# Altium footprint library OXI_ONE.PcbLib: 74 footprints (part 1 of 5)
Each footprint in its own frame and in the unit in brackets; x right, y up, seen from the top. Pads: shape width x height; smd on the part's side, far side on the other; paste and mask are expansions set on the pad; w line width, h text height; cw(c..) or ccw(c..) is an arc to the next point about the centre after c.
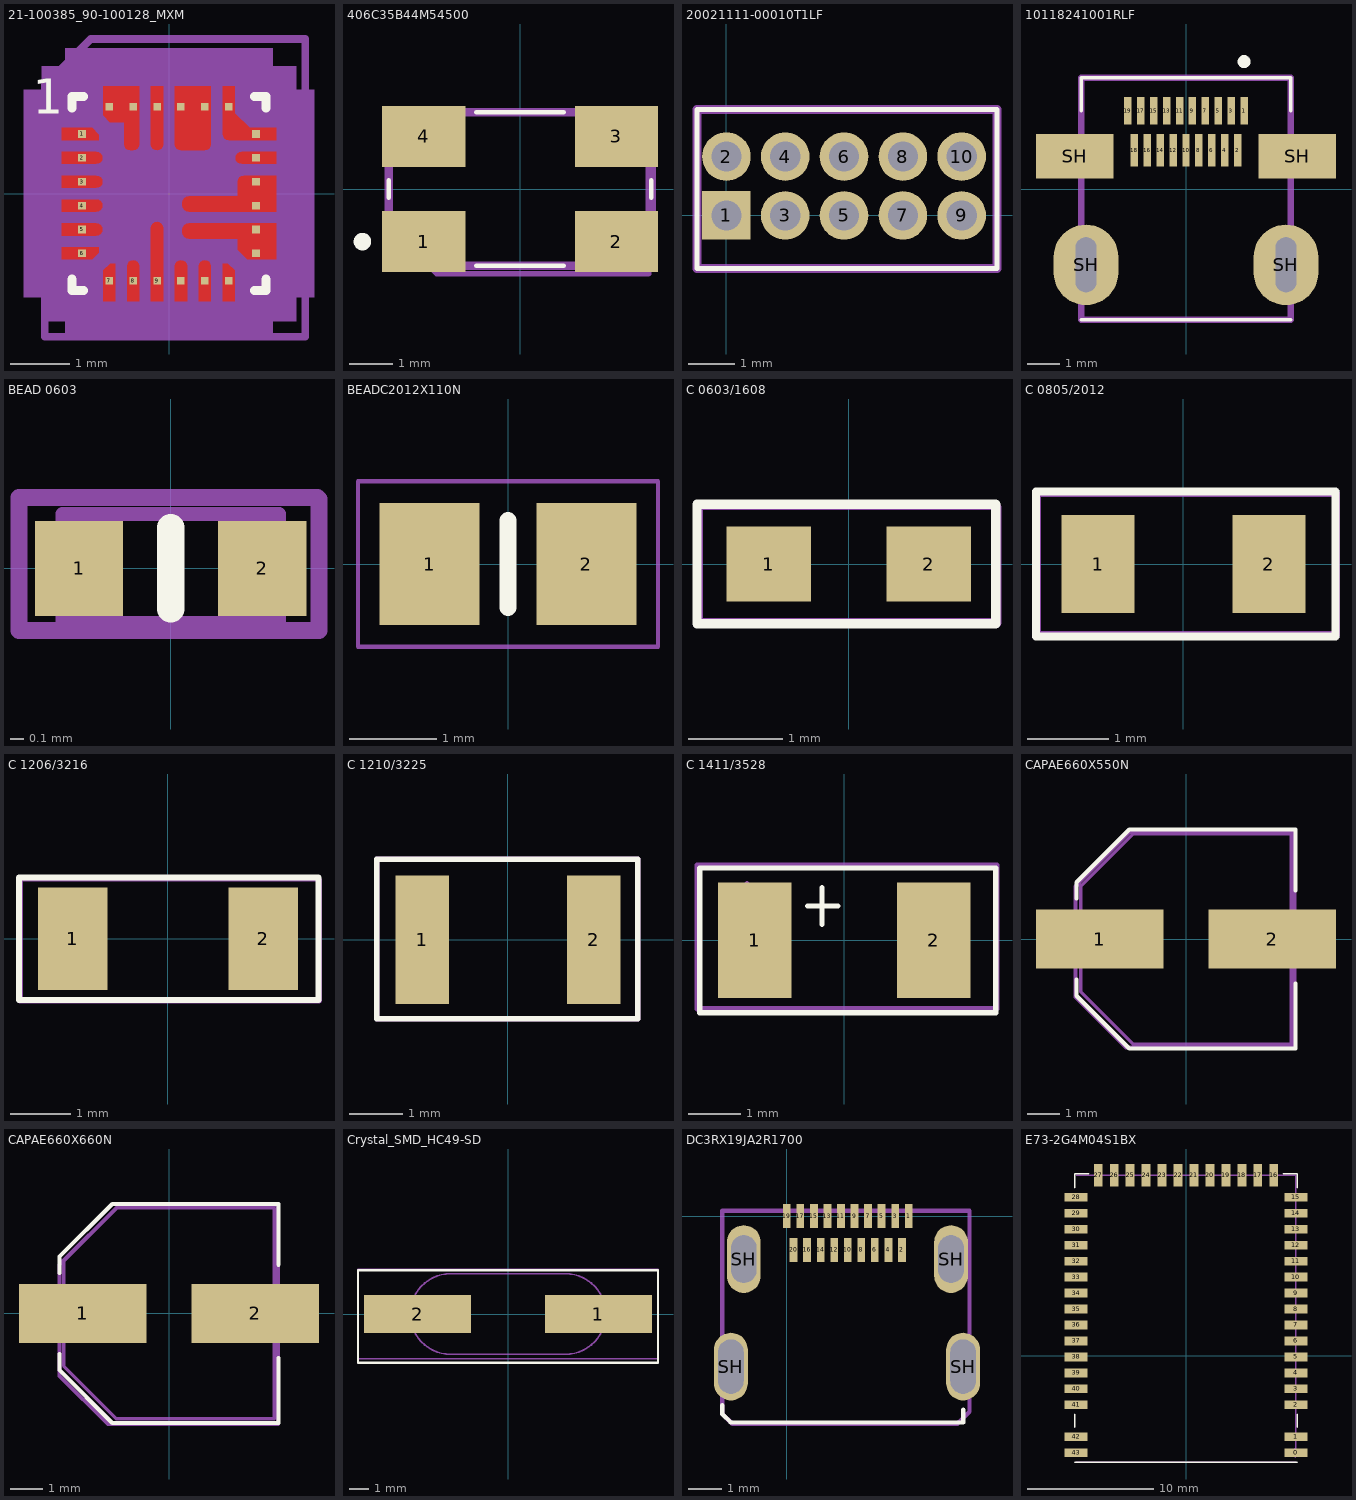
[diagram p0: the footprints below, top view; thin cyan lines are the x and y axes]

## 21-100385_90-100128_MXM [mil]
pads (24):
  rect 5x5 smd: 1(-57.36,39.37) 2(-57.36,23.62) 3(-57.36,7.87) 4(-57.36,-7.87) 5(-57.36,-23.62) 6(-57.36,-39.37) 7(-39.37,-57.36) 8(-23.62,-57.36) 9(-7.87,-57.36) 10(7.87,-57.36) 11(23.62,-57.36) 12(39.37,-57.36) 13(57.36,-39.37) 14(57.36,-23.62) 15(57.36,-7.87) 16(57.36,7.87) 17(57.36,23.62) 18(57.36,39.37) 19(39.37,57.36) 20(23.62,57.36) 21(7.87,57.36) 22(-7.87,57.36) 23(-23.62,57.36) 24(-39.37,57.36)
Top Layer:
  region: 49.26,11.87 70.86,11.87 70.86,-11.87 12.88,-11.87 11.35,-11.57 10.05,-10.7 9.18,-9.4 8.88,-7.87 8.88,-5.87 9.18,-4.34 10.05,-3.04 11.35,-2.17 12.88,-1.87 45.27,-1.87 45.26,7.87 45.56,9.4 46.43,10.7 47.73,11.57
  region: 35.37,43.86 35.37,70.86 43.37,70.86 43.37,53.15 53.15,43.37 70.86,43.37 70.86,35.37 43.86,35.37 39.41,35.37 37.88,35.67 36.59,36.54 35.72,37.84 35.41,39.37
  region: 3.87,32.56 3.87,70.86 27.62,70.86 27.62,32.56 27.32,31.03 26.45,29.73 25.15,28.87 23.62,28.56 7.87,28.56 6.34,28.87 5.05,29.73 4.18,31.03
  region: 47.88,19.62 70.86,19.62 70.86,27.62 47.88,27.62 46.35,27.32 45.05,26.45 44.18,25.15 43.88,23.62 44.18,22.09 45.05,20.79 46.35,19.93
  region: 51.65,-43.37 70.86,-43.37 70.86,-19.62 12.88,-19.62 11.35,-19.93 10.05,-20.79 9.18,-22.09 8.88,-23.62 8.88,-25.63 9.18,-27.16 10.05,-28.46 11.35,-29.33 12.88,-29.63 45.27,-29.62 45.27,-36.99
  region: 35.37,-70.86 35.37,-46.26 38.83,-46.26 43.37,-50.67 43.37,-70.86
  region: 19.62,-47.88 19.62,-70.86 27.62,-70.86 27.62,-47.88 27.32,-46.35 26.45,-45.05 25.15,-44.18 23.62,-43.88 22.09,-44.18 20.79,-45.05 19.93,-46.35
  region: 3.87,-47.88 3.87,-70.86 11.87,-70.86 11.87,-47.88 11.57,-46.35 10.7,-45.05 9.4,-44.18 7.87,-43.88 6.34,-44.18 5.05,-45.05 4.18,-46.35
  region: -43.37,51.65 -43.37,70.86 -19.62,70.86 -19.62,32.56 -19.93,31.03 -20.79,29.73 -22.09,28.87 -23.62,28.56 -25.63,28.56 -27.16,28.87 -28.46,29.73 -29.33,31.03 -29.63,32.56 -29.62,47.24 -38.96,47.24
  region: -47.88,11.87 -70.86,11.87 -70.86,3.87 -47.88,3.87 -46.35,4.18 -45.05,5.05 -44.18,6.34 -43.88,7.87 -44.18,9.4 -45.05,10.7 -46.35,11.57
  region: -47.88,27.62 -70.86,27.62 -70.86,19.62 -47.88,19.62 -46.35,19.93 -45.05,20.79 -44.18,22.09 -43.88,23.62 -44.18,25.15 -45.05,26.45 -46.35,27.32
  region: -70.86,35.37 -46.26,35.37 -46.26,38.83 -50.67,43.37 -70.86,43.37
  region: -3.87,32.56 -3.87,70.86 -11.87,70.86 -11.87,32.56 -11.57,31.03 -10.7,29.73 -9.4,28.87 -7.87,28.56 -6.34,28.87 -5.05,29.73 -4.18,31.03
  region: -70.86,-35.37 -46.26,-35.37 -46.26,-38.83 -50.67,-43.37 -70.86,-43.37
  region: -47.88,-19.62 -70.86,-19.62 -70.86,-27.62 -47.88,-27.62 -46.35,-27.32 -45.05,-26.45 -44.18,-25.15 -43.88,-23.62 -44.18,-22.09 -45.05,-20.79 -46.35,-19.93
  region: -47.88,-3.87 -70.86,-3.87 -70.86,-11.87 -47.88,-11.87 -46.35,-11.57 -45.05,-10.7 -44.18,-9.4 -43.88,-7.87 -44.18,-6.34 -45.05,-5.05 -46.35,-4.18
  region: -35.37,-70.86 -35.37,-46.26 -38.83,-46.26 -43.37,-50.67 -43.37,-70.86
  region: -70.86,-35.37 -46.26,-35.37 -46.26,-38.83 -50.67,-43.37 -70.86,-43.37
  region: -11.87,-22.68 -11.87,-70.86 -3.87,-70.86 -3.87,-22.68 -4.18,-21.15 -5.05,-19.85 -6.34,-18.99 -7.87,-18.68 -9.4,-18.99 -10.7,-19.85 -11.57,-21.15
  region: -27.62,-47.88 -27.62,-70.86 -19.62,-70.86 -19.62,-47.88 -19.93,-46.35 -20.79,-45.05 -22.09,-44.18 -23.62,-43.88 -25.15,-44.18 -26.45,-45.05 -27.32,-46.35
Top Overlay:
  lines w6: -64,-56.47 -64,-64 -56.47,-64 ; -64,56.47 -64,64 -56.47,64 ; 56.47,-64 64,-64 64,-56.47 ; 56.47,64 64,64 64,56.47
  text "1" at -90,45 h39.37
Top Paste:
  drawing of 19 lines, arcs and shapes, not listed
Top Solder:
  drawing of 19 lines, arcs and shapes, not listed
Bottom Assembly:
  region: 68.37,95.86 -68.37,95.86 -68.37,84 -84,84 -84,68.37 -95.86,68.37 -95.86,-68.37 -84,-68.37 -84,-84 -68.37,-84 -68.37,-95.86 68.37,-95.86 68.37,-84 84,-84 84,-68.37 95.86,-68.37 95.86,68.37 84,68.37 84,84 68.37,84
Mechanical 13:
  lines w1: -59,9 -9,59 ; -59,-59 59,-59 59,59 -59,59 -59,-59
Mechanical 15:
  region: 53.37,80.86 -53.37,80.86 -53.37,69 -69,69 -69,53.37 -80.86,53.37 -80.86,-53.37 -69,-53.37 -69,-69 -53.37,-69 -53.37,-80.86 53.37,-80.86 53.37,-69 69,-69 69,-53.37 80.86,-53.37 80.86,53.37 69,53.37 69,69 53.37,69
  lines w6: -80.86,-53.37 -80.86,53.37 -69,53.37 -69,69 -53.37,69 -53.37,80.86 53.37,80.86 53.37,69 69,69 69,53.37 80.86,53.37 80.86,-53.37 69,-53.37 69,-69 53.37,-69 53.37,-80.86 -53.37,-80.86 -53.37,-69 -69,-69 -69,-53.37 -80.86,-53.37
Top Assembly (Mech29):
  lines w5: -82,-94.5 90,-94.5 90,102 -51.5,102 -82,71.5 -82,-94.5
  text ".Designator" at -60.5,-43.5 h39.37
3D body: height 10, standoff 0, extent -60,-60 60,60

## 406C35B44M54500 [mm]
pads (4):
  rect 1.9x1.4 smd: 1(-2.2,-1.2) 2(2.2,-1.2) 3(2.2,1.2) 4(-2.2,1.2)
Top Overlay:
  lines w0.1: -3,-0.2 -3,0.2 ; -1,-1.75 1,-1.75 ; -1,1.75 1,1.75 ; 3,-0.2 3,0.2
  lines w0.2: -3.6,-1.3 cw(c-3.6,-1.2) -3.6,-1.1 cw(c-3.6,-1.2) -3.6,-1.3
Mechanical 13:
  lines w0.2: -3,-1.75 3,-1.75 3,1.75 -3,1.75 -3,-1.75
Top Assembly (Mech29):
  lines w0.127: -3,-0.835 -3,1.791 2.934,1.791 2.934,-1.93 -1.905,-1.93 -3,-0.835
  text ".Designator" at -2.108,-0.483 h1
3D body "406I35D08M00000.stp": height 1.3, standoff 0, extent -3.01,-1.76 3.01,1.76

## 20021111-00010T1LF [mm]
pads (10):
  rect 1.05x1.05 hole 0.65: 1(0,0)
  round 1.05 hole 0.65: 2(0,1.27) 3(1.27,0) 4(1.27,1.27) 5(2.54,0) 6(2.54,1.27) 7(3.81,0) 8(3.81,1.27) 9(5.08,0) 10(5.08,1.27)
Top Overlay:
  lines w0.1: -0.635,-1.145 -0.635,2.286 5.842,2.286 5.842,-1.145 -0.635,-1.145
Top Assembly (Mech29):
  lines w0.2: -0.635,-1.145 5.842,-1.145 5.842,2.286 -0.635,2.286 -0.635,-1.145
  text ".Designator" at 0.381,0.254 h1
3D body "20021111-00010XXLFc.stp": height 5.5, standoff -2.35, extent -0.635,-1.143 5.715,2.257

## 10118241001RLF [mm]
pads (23):
  rect 0.23x0.85 smd: 1(1.8,2.425) 3(1.4,2.425) 5(1,2.425) 7(0.6,2.425) 9(0.2,2.425) 11(-0.2,2.425) 13(-0.6,2.425) 15(-1,2.425) 17(-1.4,2.425) 19(-1.8,2.425)
  rect 0.23x1 smd: 2(1.6,1.2) 4(1.2,1.2) 6(0.8,1.2) 8(0.4,1.2) 10(0,1.2) 12(-0.4,1.2) 14(-0.8,1.2) 16(-1.2,1.2) 18(-1.6,1.2)
  rect 2.4x1.38 smd: SH(-3.45,1.02) SH(3.45,1.02)
  oval 2x2.5 hole 0.65 slot 1.7 at 90 deg: SH(-3.1,-2.35) SH(3.1,-2.35)
Top Overlay:
  lines w0.1: -3.25,-4.05 3.25,-4.05 ; -3.25,2.425 -3.25,3.45 3.25,3.45 3.25,2.425
  lines w0.2: 1.7,3.95 ccw(c1.8,3.95) 1.9,3.95 ccw(c1.8,3.95) 1.7,3.95
Top Assembly (Mech29):
  lines w0.2: -3.25,-4.05 3.25,-4.05 3.25,3.45 -3.25,3.45 -3.25,-4.05
  text ".Designator" at -1.27,-1.016 h1
3D body "10118241-001rlf_asm.STEP": height 3.08, standoff -0.45, extent -4.45,-4.833 4.45,2.667

## BEAD 0603 [mm]
pads (2):
  rect 0.65x0.7 smd: 1(-0.675,0) 2(0.675,0)
Top Overlay:
  lines w0.2: 0,-0.3 0,0.3
Mechanical 13:
  lines w0.1: -0.8,-0.4 -0.8,0.4 0.8,0.4 0.8,-0.4 -0.8,-0.4
Top Assembly (Mech29):
  lines w0.127: -1.118,-0.457 1.092,-0.457 1.092,0.508 1.079,0.521 -1.118,0.521 -1.118,-0.457
  text ".Designator" at -0.991,-0.406 h1
3D body "BLM18AG121SN1D.stp": height 0.8, standoff 0, extent -0.8,-0.4 0.8,0.4

## BEADC2012X110N [mm]
pads (2):
  rect 1.15x1.4 smd: 1(-0.9,0) 2(0.9,0)
Top Overlay:
  lines w0.2: 0,-0.5 0,0.5
Top Assembly (Mech29):
  lines w0.05: -1.725,-0.95 -1.725,0.95 1.725,0.95 1.725,-0.95 -1.725,-0.95
  text ".Designator" at -1.524,-0.699 h1
3D body "MH2029-121Y.stp": height 1.1, standoff 0, extent -1,-0.6 1,0.6

## C 0603/1608 [mm]
pads (2):
  rect 0.9x0.8 smd: 1(-0.85,0) 2(0.85,0)
Top Overlay:
  lines w0.1: -1.612,-0.635 -1.612,0.635 1.563,0.635 1.563,-0.635 -1.612,-0.635
Top Assembly (Mech29):
  lines w0.1: -1.6,-0.625 -1.6,0.625 1.55,0.625 1.575,0.6 1.575,-0.625 -1.6,-0.625
  text ".Designator" at -1.4,-0.4 h0.8
3D body: height 0.64, standoff 0, extent -0.85,-0.4 0.85,0.4
3D body: height 0.64, standoff 0, extent -1.3,-0.4 -0.85,0.4
3D body: height 0.64, standoff 0, extent 0.85,-0.4 1.3,0.4

## C 0805/2012 [mm]
pads (2):
  rect 0.9x1.2 smd: 1(-1.05,0) 2(1.05,0)
Top Overlay:
  lines w0.1: -1.812,-0.889 1.871,-0.889 1.871,0.889 -1.812,0.889 -1.812,-0.889
Top Assembly (Mech29):
  lines w0.1: -1.8,-0.875 1.875,-0.875 1.875,0.875 -1.775,0.875 -1.8,0.85 -1.8,-0.875
  text ".Designator" at -1.675,-0.55 h1
3D body: height 0.64, standoff 0, extent -1.05,-0.6 1.1,0.6
3D body: height 0.64, standoff 0, extent -1.5,-0.6 -1.05,0.6
3D body: height 0.64, standoff 0, extent 1.1,-0.6 1.5,0.6

## C 1206/3216 [mm]
pads (2):
  rect 1.15x1.7 smd: 1(-1.575,0) 2(1.575,0)
Top Overlay:
  lines w0.1: -2.464,-1.016 -2.464,1.016 2.489,1.016 2.489,-1.016 -2.464,-1.016
Top Assembly (Mech29):
  lines w0.1: -2.45,-1.025 -2.45,1 2.475,1 2.5,0.975 2.5,-1.025 -2.425,-1.025 -2.45,-1.025
  text ".Designator" at -2.225,-0.825 h1
3D body: height 0.64, standoff 0, extent -1.55,-0.85 1.65,0.85
3D body: height 0.64, standoff 0, extent -2.15,-0.85 -1.55,0.85
3D body: height 0.64, standoff 0, extent 1.65,-0.85 2.15,0.85

## C 1210/3225 [mm]
pads (2):
  rect 1x2.4 smd: 1(-1.6,0) 2(1.6,0)
Top Overlay:
  lines w0.1: -2.45,-1.475 -2.45,1.5 2.425,1.5 2.425,-1.475 -2.45,-1.475
Top Assembly (Mech29):
  lines w0.1: -2.45,-1.475 -2.45,1.5 2.425,1.5 2.425,-1.475 -2.45,-1.475
  text ".Designator" at -2.175,-0.9 h1
3D body: height 0.64, standoff 0, extent -1.575,-1.2 1.625,1.2
3D body: height 0.64, standoff 0, extent 1.625,-1.2 2.1,1.2
3D body: height 0.64, standoff 0, extent -2.1,-1.2 -1.575,1.2

## C 1411/3528 [mm]
pads (2):
  rect 1.4x2.2 smd: 1(-1.7,0) 2(1.7,0)
Top Overlay:
  lines w0.1: -0.7,0.65 -0.125,0.65 ; -0.425,0.3 -0.425,1 ; -2.75,-1.375 2.875,-1.375 2.875,1.375 -2.75,1.375 -2.75,-1.375
Top Assembly (Mech29):
  lines w0.1: -2.05,0.775 -1.6,0.775 ; -1.85,0.575 -1.85,1.075 ; -2.8,-1.3 2.9,-1.3 2.9,1.425 -2.8,1.425 -2.8,-1.3
  text ".Designator" at -1.55,-0.5 h1
3D body "T520B227M006ATE045.step": height 2.11, standoff 0.01, extent -1.875,-1.525 1.825,1.475

## CAPAE660X550N [mm]
pads (2):
  rect 4x1.85 smd: 1(-2.7,0) 2(2.7,0)
Top Overlay:
  lines w0.127: -3.429,-1.27 -3.429,-1.778 -1.778,-3.429 3.429,-3.429 3.429,-1.397 ; -3.429,1.27 -3.429,1.778 -1.778,3.429 3.429,3.429 3.429,1.524
Mechanical 13:
  lines w0.1: -3.3,-1.65 -1.65,-3.3 3.3,-3.3 3.3,3.3 -1.65,3.3 -3.3,1.65 -3.3,-1.65
Top Assembly (Mech29):
  lines w0.127: -3.467,-1.816 -3.467,-1.778 -3.467,1.651 -3.213,1.905 -1.765,3.353 3.404,3.353 3.404,-3.391 3.391,-3.404 -1.88,-3.404 -3.467,-1.816
  text ".Designator" at -2.286,-0.254 h1
3D body "AVE107M06D16T-F.stp": height 5.5, standoff 0, extent -4,-3.4 4,3.4

## CAPAE660X660N [mm]
pads (2):
  rect 4x1.85 smd: 1(-2.7,0) 2(2.7,0)
Top Overlay:
  lines w0.127: -3.429,-1.27 -3.429,-1.778 -1.778,-3.429 3.429,-3.429 3.429,-1.397 ; -3.429,1.27 -3.429,1.778 -1.778,3.429 3.429,3.429 3.429,1.524
Mechanical 13:
  lines w0.1: -3.3,-1.65 -3.3,1.65 -1.65,3.3 3.3,3.3 3.3,-3.3 -1.65,-3.3 -3.3,-1.65
Top Assembly (Mech29):
  lines w0.127: -3.429,-1.956 -3.429,-1.524 -3.429,1.524 -1.549,3.404 3.365,3.404 3.416,3.353 3.416,-3.467 -1.918,-3.467 -3.429,-1.956
  text ".Designator" at -2.286,-0.254 h1
3D body "User Library-CAPSMD6_3x3_9.STEP": height 3.91, standoff 0, extent -3.614,-3.311 3.386,3.289

## Crystal_SMD_HC49-SD [mm]
pads (2):
  rect 5.6x2 smd mask+0.051: 1(4.75,0) 2(-4.75,0)
Top Overlay:
  lines w0.127: -7.874,-2.55 -7.874,2.286 -5.636,2.286 7.874,2.286 7.874,-2.55 -5.9,-2.55 -7.874,-2.55
Top Assembly (Mech29):
  lines w0.1: -7.874,-2.35 7.874,-2.35 7.874,2.35 -7.874,2.35 -7.874,-2.35 ; -3.015,-2.115 cw(c-3.015,0) -3.015,2.115 3.015,2.115 cw(c3.015,0) 3.015,-2.115 -3.015,-2.115
  text ".Designator" at -1.143,-0.508 h1
3D body "User Library-hc49_cystal.step": height 5.08, standoff 0, extent -6.604,-2.487 6.796,2.413

## DC3RX19JA2R1700 [mm]
pads (23):
  rect 0.23x0.7 smd: 1(3.6,0) 2(3.4,-1) 3(3.2,0) 4(3,-1) 5(2.8,0) 6(2.6,-1) 7(2.4,0) 8(2.2,-1) 9(2,0) 10(1.8,-1) 11(1.6,0) 12(1.4,-1) 13(1.2,0) 14(1,-1) 15(0.8,0) 16(0.6,-1) 17(0.4,0) 19(0,0) 20(0.2,-1)
  oval 1x2 hole 0.75 slot 1.6 at 90 deg: SH(-1.651,-4.445) SH(5.207,-4.445)
  oval 1x2 hole 0.75 slot 1.4 at 90 deg: SH(-1.27,-1.27) SH(4.85,-1.27)
Top Overlay:
  lines w0.127: -1.905,-5.588 -1.905,-5.842 -1.651,-6.096 4.953,-6.096 5.207,-6.096 5.207,-5.715
Top Assembly (Mech29):
  lines w0.127: -1.905,-5.842 -1.613,-6.134 5.042,-6.134 5.397,-5.779 5.397,0.152 -1.905,0.152 -1.905,-5.842
  text ".Designator" at -0.318,-3.556 h1
3D body "K3D-DC3RX19JA2-V1_JAE_Proprietary.STEP": height 2.9, standoff -0.8, extent -1.85,-6.963 5.45,0.187

## E73-2G4M04S1BX [mm]
pads (44):
  rect 1.8x0.7 smd mask+0.051: 0(8.75,-7.72) 1(8.75,-6.45) 2(8.75,-3.91) 3(8.75,-2.64) 4(8.75,-1.37) 5(8.75,-0.1) 6(8.75,1.17) 7(8.75,2.44) 8(8.75,3.71) 9(8.75,4.98) 10(8.75,6.25) 11(8.75,7.52) 12(8.75,8.79) 13(8.75,10.06) 14(8.75,11.33) 15(8.75,12.6) 28(-8.75,12.6) 29(-8.75,11.33) 30(-8.75,10.06) 31(-8.75,8.79) 32(-8.75,7.52) 33(-8.75,6.25) 34(-8.75,4.98) 35(-8.75,3.71) 36(-8.75,2.44) 37(-8.75,1.17) 38(-8.75,-0.1) 39(-8.75,-1.37) 40(-8.75,-2.64) 41(-8.75,-3.91) 42(-8.75,-6.45) 43(-8.75,-7.72)
  rect 0.7x1.8 smd mask+0.051: 16(6.985,14.35) 17(5.715,14.35) 18(4.445,14.35) 19(3.175,14.35) 20(1.905,14.35) 21(0.635,14.35) 22(-0.635,14.35) 23(-1.905,14.35) 24(-3.175,14.35) 25(-4.445,14.35) 26(-5.715,14.35) 27(-6.985,14.35)
Top Overlay:
  lines w0.12: -8.87,-8.49 8.87,-8.49 ; -8.87,-5.7 -8.87,-4.66 ; -8.87,13.35 -8.87,14.47 -7.72,14.47 ; 7.72,14.47 8.87,14.47 8.87,13.35 ; 8.87,-5.7 8.87,-4.66
Mechanical 2:
  lines w0.1: -8.75,-8.5 8.75,-8.5
Bottom Assembly:
  lines w0.1: -8.75,14.35 8.75,14.35 8.75,-7.37 8.4,-7.72 8.75,-8.07
Top Assembly (Mech29):
  text ".Designator" at -2.032,-0.635 h1
3D body: height 2, standoff 0, extent -8.89,-8.382 8.763,14.351